# Altium footprint library Connector_art.PcbLib: 209 footprints (part 13 of 14)
Each footprint in its own frame and in the unit in brackets; x right, y up, seen from the top. Pads: shape width x height; smd on the part's side, far side on the other; paste and mask are expansions set on the pad; w line width, h text height; cw(c..) or ccw(c..) is an arc to the next point about the centre after c.
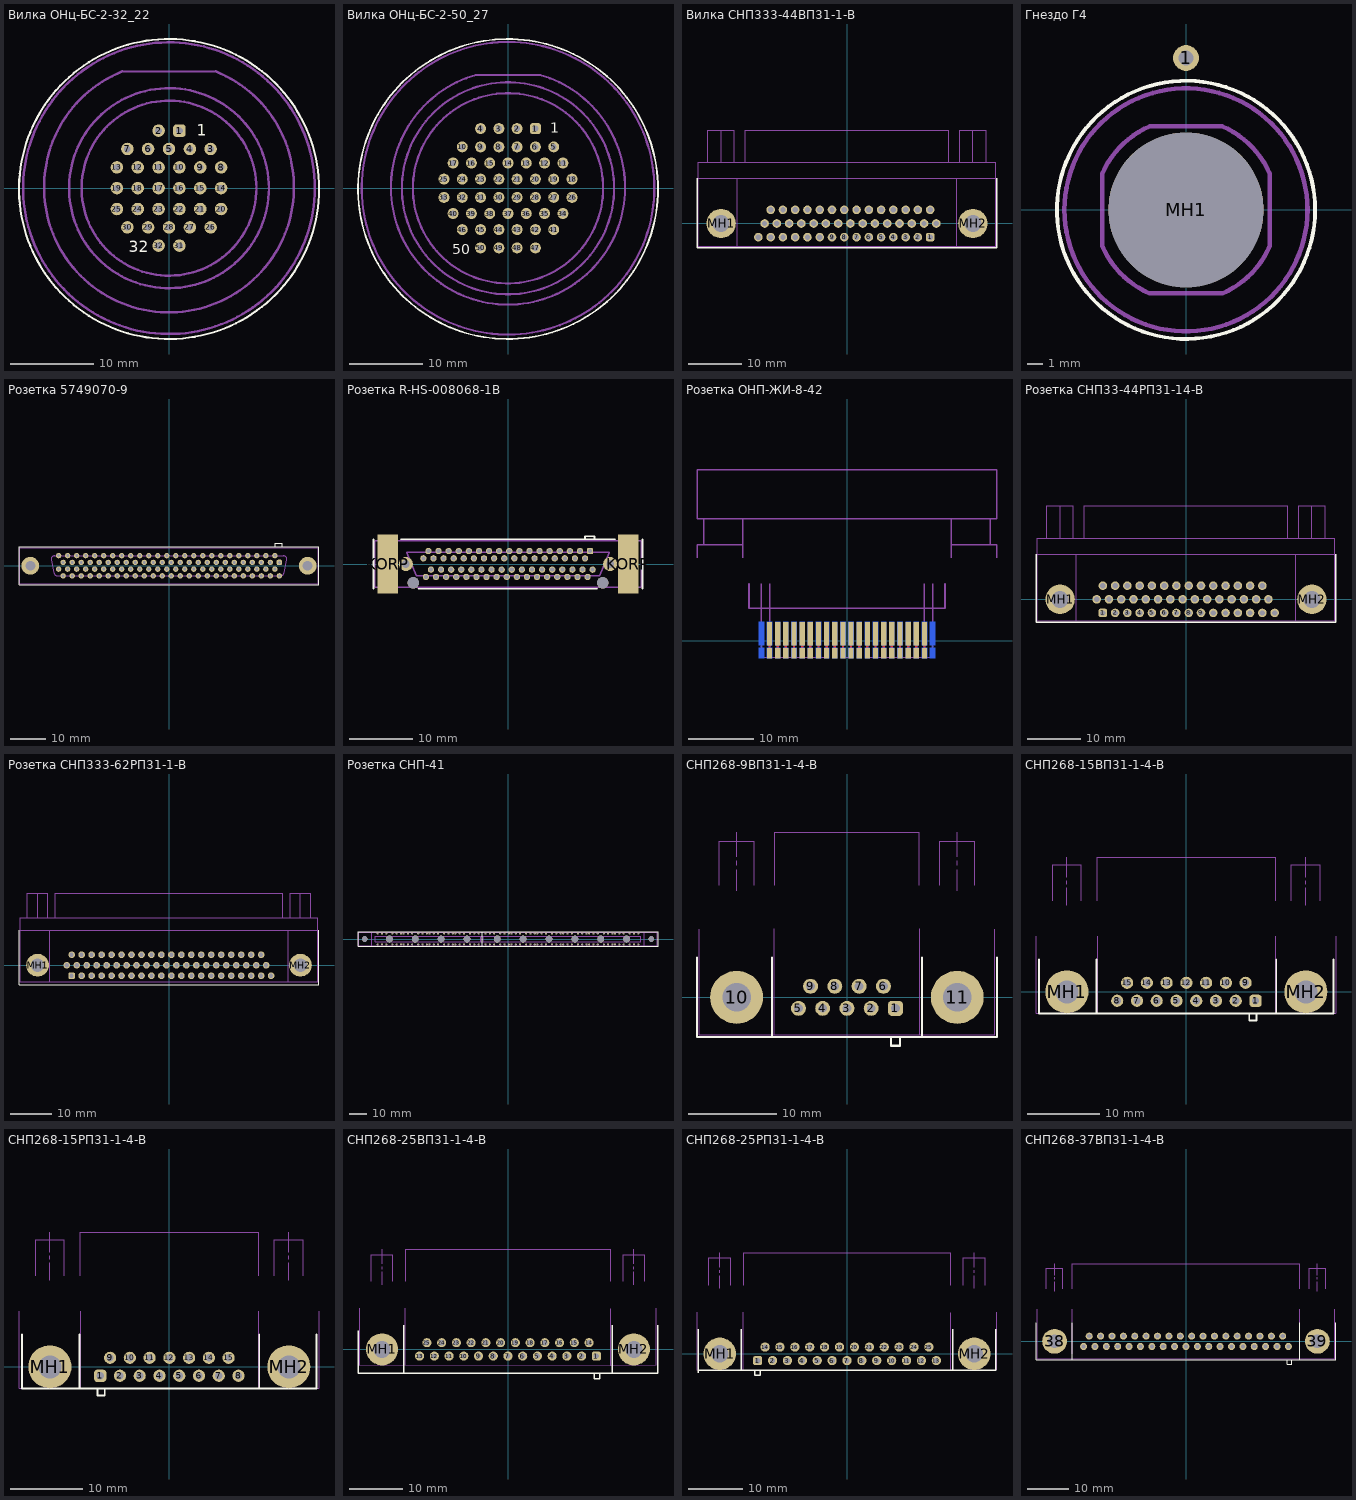
[diagram p12: the footprints below, top view; thin cyan lines are the x and y axes]

## Вилка ОНц-БС-2-32_22 [mm]
height 20
pads (32):
  rrect50% 1.5x1.5 hole 0.8: 1(1.25,6.9)
  round 1.5 hole 0.8: 2(-1.25,6.9) 3(5,4.7) 4(2.5,4.7) 5(0,4.7) 6(-2.5,4.7) 7(-5,4.7) 8(6.25,2.5) 9(3.75,2.5) 10(1.25,2.5) 11(-1.25,2.5) 12(-3.75,2.5) 13(-6.25,2.5) 14(6.25,0) 15(3.75,0) 16(1.25,0) 17(-1.25,0) 18(-3.75,0) 19(-6.25,0) 20(6.25,-2.5) 21(3.75,-2.5) 22(1.25,-2.5) 23(-1.25,-2.5) 24(-3.75,-2.5) 25(-6.25,-2.5) 26(5,-4.7) 27(2.5,-4.7) 28(0,-4.7) 29(-2.5,-4.7) 30(-5,-4.7) 31(1.25,-6.9) 32(-1.25,-6.9)
Top Overlay:
  circle w0.25: c0,-0.1 r18
  text "1" at 3.3,6.3 h1.38
  text "32" at -4.8,-7.7 h1.38
Bottom Overlay:
  circle w0.25: c0,0 r10.75
  text "1" at 3.9,6.3 h1.38
  text "32" at -2.8,-7.7 h1.38
Mechanical 1:
  circle w0.3: c0,0 r10.5
  circle w0.3: c0,0 r12
  circle w0.3: c0,0 r17.5
  circle w0.3: c-1.25,-6.9 r0.5
  circle w0.3: c1.25,-6.9 r0.5
  circle w0.3: c5,-4.7 r0.5
  circle w0.3: c2.5,-4.7 r0.5
  circle w0.3: c0,-4.7 r0.5
  circle w0.3: c-2.5,-4.7 r0.5
  circle w0.3: c-5,-4.7 r0.5
  circle w0.3: c-6.25,-2.5 r0.5
  circle w0.3: c-3.75,-2.5 r0.5
  circle w0.3: c-1.25,-2.5 r0.5
  circle w0.3: c1.25,-2.5 r0.5
  circle w0.3: c3.75,-2.5 r0.5
  circle w0.3: c6.25,-2.5 r0.5
  circle w0.3: c6.25,0 r0.5
  circle w0.3: c3.75,0 r0.5
  circle w0.3: c1.25,0 r0.5
  circle w0.3: c-1.25,0 r0.5
  circle w0.3: c-3.75,0 r0.5
  circle w0.3: c-6.25,0 r0.5
  circle w0.3: c-6.25,2.5 r0.5
  circle w0.3: c-3.75,2.5 r0.5
  circle w0.3: c-1.25,2.5 r0.5
  circle w0.3: c1.25,2.5 r0.5
  circle w0.3: c3.75,2.5 r0.5
  circle w0.3: c6.25,2.5 r0.5
  circle w0.3: c5,4.7 r0.5
  circle w0.3: c2.5,4.7 r0.5
  circle w0.3: c0,4.7 r0.5
  circle w0.3: c-2.5,4.7 r0.5
  circle w0.3: c-5,4.7 r0.5
  circle w0.3: c-1.25,6.9 r0.5
  circle w0.3: c1.25,6.9 r0.5
  lines w0.3: -5.605,14.013 ccw(c0,0.1) 5.605,14.013 ; -5.6,14 5.6,14
  text "1" at 3,6.3 h2
  text "32" at -4.5,-7.7 h2
3D body: height 19.9, standoff -3.5, extent -17.5,-18.486 17.5,18.486

## Вилка ОНц-БС-2-50_27 [mm]
height 20
pads (50):
  rrect50% 1.5x1.5 hole 0.8: 1(3.75,8.15)
  round 1.5 hole 0.8: 2(1.25,8.15) 3(-1.25,8.15) 4(-3.75,8.15) 5(6.25,5.65) 6(3.75,5.65) 7(1.25,5.65) 8(-1.25,5.65) 9(-3.75,5.65) 10(-6.25,5.65) 11(7.5,3.45) 12(5,3.45) 13(2.5,3.45) 14(0,3.45) 15(-2.5,3.45) 16(-5,3.45) 17(-7.5,3.45) 18(8.75,1.25) 19(6.25,1.25) 20(3.75,1.25) 21(1.25,1.25) 22(-1.25,1.25) 23(-3.75,1.25) 24(-6.25,1.25) 25(-8.75,1.25) 26(8.75,-1.25) 27(6.25,-1.25) 28(3.75,-1.25) 29(1.25,-1.25) 30(-1.25,-1.25) 31(-3.75,-1.25) 32(-6.25,-1.25) 33(-8.75,-1.25) 34(7.5,-3.45) 35(5,-3.45) 36(2.5,-3.45) 37(0,-3.45) 38(-2.5,-3.45) 39(-5,-3.45) 40(-7.5,-3.45) 41(6.25,-5.65) 42(3.75,-5.65) 43(1.25,-5.65) 44(-1.25,-5.65) 45(-3.75,-5.65) 46(-6.25,-5.65) 47(3.75,-8.15) 48(1.25,-8.15) 49(-1.25,-8.15) 50(-3.75,-8.15)
Top Overlay:
  circle w0.25: c0,-0.1 r20.5
  text "50" at -7.6,-9 h1.38
  text "1" at 5.8,7.6 h1.38
Bottom Overlay:
  circle w0.25: c0,0 r13
  text "50" at -5.5,-9 h1.38
  text "1" at 6.1,7.6 h1.38
Mechanical 1:
  circle w0.3: c0,0 r13
  circle w0.3: c0,0 r14.5
  circle w0.3: c0,0 r20
  circle w0.3: c-3.75,8.15 r0.5
  circle w0.3: c-1.25,8.15 r0.5
  circle w0.3: c1.25,8.15 r0.5
  circle w0.3: c3.75,8.15 r0.5
  circle w0.3: c-6.25,5.65 r0.5
  circle w0.3: c-3.75,5.65 r0.5
  circle w0.3: c-1.25,5.65 r0.5
  circle w0.3: c1.25,5.65 r0.5
  circle w0.3: c3.75,5.65 r0.5
  circle w0.3: c6.25,5.65 r0.5
  circle w0.3: c-7.5,3.45 r0.5
  circle w0.3: c-5,3.45 r0.5
  circle w0.3: c-2.5,3.45 r0.5
  circle w0.3: c0,3.45 r0.5
  circle w0.3: c2.5,3.45 r0.5
  circle w0.3: c5,3.45 r0.5
  circle w0.3: c7.5,3.45 r0.5
  circle w0.3: c8.75,1.25 r0.5
  circle w0.3: c6.25,1.25 r0.5
  circle w0.3: c3.75,1.25 r0.5
  circle w0.3: c1.25,1.25 r0.5
  circle w0.3: c-1.25,1.25 r0.5
  circle w0.3: c-3.75,1.25 r0.5
  circle w0.3: c-6.25,1.25 r0.5
  circle w0.3: c-8.75,1.25 r0.5
  circle w0.3: c-8.75,-1.25 r0.5
  circle w0.3: c-6.25,-1.25 r0.5
  circle w0.3: c-3.75,-1.25 r0.5
  circle w0.3: c-1.25,-1.25 r0.5
  circle w0.3: c1.25,-1.25 r0.5
  circle w0.3: c3.75,-1.25 r0.5
  circle w0.3: c6.25,-1.25 r0.5
  circle w0.3: c8.75,-1.25 r0.5
  circle w0.3: c7.5,-3.45 r0.5
  circle w0.3: c5,-3.45 r0.5
  circle w0.3: c2.5,-3.45 r0.5
  circle w0.3: c0,-3.45 r0.5
  circle w0.3: c-2.5,-3.45 r0.5
  circle w0.3: c-5,-3.45 r0.5
  circle w0.3: c-7.5,-3.45 r0.5
  circle w0.3: c-6.25,-5.65 r0.5
  circle w0.3: c-3.75,-5.65 r0.5
  circle w0.3: c-1.25,-5.65 r0.5
  circle w0.3: c1.25,-5.65 r0.5
  circle w0.3: c3.75,-5.65 r0.5
  circle w0.3: c6.25,-5.65 r0.5
  circle w0.3: c3.75,-8.15 r0.5
  circle w0.3: c1.25,-8.15 r0.5
  circle w0.3: c-1.25,-8.15 r0.5
  circle w0.3: c-3.75,-8.15 r0.5
  lines w0.25: -4.396,15.5 4.396,15.5
  lines w0.3: -4.396,15.484 ccw(c0,0.1) 4.396,15.484
  text "50" at -6.9,-9 h2
  text "1" at 5.2,7.5 h2
3D body: height 19.9, standoff -3.5, extent -20,-20.797 20,20.797

## Вилка СНП333-44ВП31-1-В [mm]
pads (46):
  rrect50% 1.6x1.6 hole 1: 1(15.52,-2.54)
  round 1.6 hole 1: 2(13.23,-2.54) 3(10.94,-2.54) 4(8.65,-2.54) 5(6.36,-2.54) 6(4.07,-2.54) 7(1.78,-2.54) 8(-0.51,-2.54) 9(-2.8,-2.54) 10(-5.09,-2.54) 11(-7.38,-2.54) 12(-9.67,-2.54) 13(-11.96,-2.54) 14(-14.25,-2.54) 15(-16.54,-2.54) 16(16.67,0) 17(14.38,0) 18(12.09,0) 19(9.8,0) 20(7.51,0) 21(5.22,0) 22(2.93,0) 23(0.64,0) 24(-1.65,0) 25(-3.94,0) 26(-6.23,0) 27(-8.52,0) 28(-10.81,0) 29(-13.1,0) 30(-15.39,0) 31(15.52,2.54) 32(13.23,2.54) 33(10.94,2.54) 34(8.65,2.54) 35(6.36,2.54) 36(4.07,2.54) 37(1.78,2.54) 38(-0.51,2.54) 39(-2.8,2.54) 40(-5.09,2.54) 41(-7.38,2.54) 42(-9.67,2.54) 43(-11.96,2.54) 44(-14.25,2.54)
  round 5.5 hole 3.2: MH1(-23.5,0) MH2(23.5,0)
Top Overlay:
  lines w0.25: -28,8.44 -28,-4.5 28,-4.5 28,8.44
Mechanical 1:
  lines w0.2: -27.75,8.44 27.75,8.44 ; -26,11.44 -26,17.44 -21,17.44 -21,11.44 ; -23.5,11.44 -23.5,17.44 ; -20.5,-4.56 -20.5,8.44 ; -19,11.44 -19,17.44 19,17.44 19,11.44 ; 20.5,-4.56 20.5,8.44 ; 21,11.44 21,17.44 26,17.44 26,11.44 ; 23.5,11.44 23.5,17.44 ; -27.75,-4.25 27.75,-4.25 27.75,11.44 -27.75,11.44 -27.75,-4.25
  text "1" at 17.052,-3.797 h2.12
  text "15" at -20.174,-3.797 h2.12
  text "31" at 16.656,1.283 h2.12
  text "16" at 17.926,-1.257 h2.12
  text "44" at -17.634,1.283 h2.12
  text "30" at -18.904,-1.257 h2.12
3D body: height 13.9, standoff -3.9, extent -27.8,-4.31 27.8,17.49

## Гнездо Г4 [mm]
height 8.58
pads (2):
  round 1.7 hole 1: 1(0,10)
  round 10.2 hole 10.2 unplated paste+0: MH1(0,0)
Top Overlay:
  circle w0.25: c0,0 r8.5
Bottom Overlay:
  circle w0.25: c0,10 r1.25
  circle w0.25: c0,0 r7
Mechanical 1:
  circle w0.3: c0,0 r2
  circle w0.3: c0,0 r4.5
  circle w0.3: c-0.003,0 r8
  lines w0.3: -5.5,-2.4 -5.5,2.4 ; -5.499,-2.4 ccw(c0,0) -2.4,-5.499 ; -5.499,2.4 cw(c0,0) -2.4,5.499 ; -2.4,-5.5 2.4,-5.5 ; -2.4,5.5 2.4,5.5 ; 2.4,-5.499 ccw(c0,0) 5.499,-2.4 ; 2.4,5.499 cw(c0,0) 5.499,2.4 ; 5.5,-2.4 5.5,2.4
3D body: height 8.5, standoff -17, extent -8.002,-8.002 7.998,7.998

## Розетка 5749070-9 [mm]
height 8
pads (102):
  rrect50% 1.5x1.5 hole 0.8: 1(31.115,0.95)
  round 1.5 hole 0.8: 2(29.845,2.85) 3(28.575,0.95) 4(27.305,2.85) 5(26.035,0.95) 6(24.765,2.85) 7(23.495,0.95) 8(22.225,2.85) 9(20.955,0.95) 10(19.685,2.85) 11(18.415,0.95) 12(17.145,2.85) 13(15.875,0.95) 14(14.605,2.85) 15(13.335,0.95) 16(12.065,2.85) 17(10.795,0.95) 18(9.525,2.85) 19(8.255,0.95) 20(6.985,2.85) 21(5.715,0.95) 22(4.445,2.85) 23(3.175,0.95) 24(1.905,2.85) 25(0.635,0.95) 26(-0.635,2.85) 27(-1.905,0.95) 28(-3.175,2.85) 29(-4.445,0.95) 30(-5.715,2.85) 31(-6.985,0.95) 32(-8.255,2.85) 33(-9.525,0.95) 34(-10.795,2.85) 35(-12.065,0.95) 36(-13.335,2.85) 37(-14.605,0.95) 38(-15.875,2.85) 39(-17.145,0.95) 40(-18.415,2.85) 41(-19.685,0.95) 42(-20.955,2.85) 43(-22.225,0.95) 44(-23.495,2.85) 45(-24.765,0.95) 46(-26.035,2.85) 47(-27.305,0.95) 48(-28.575,2.85) 49(-29.845,0.95) 50(-31.115,2.85) 51(31.115,-2.85) 52(29.845,-0.95) 53(28.575,-2.85) 54(27.305,-0.95) 55(26.035,-2.85) 56(24.765,-0.95) 57(23.495,-2.85) 58(22.225,-0.95) 59(20.955,-2.85) 60(19.685,-0.95) 61(18.415,-2.85) 62(17.145,-0.95) 63(15.875,-2.85) 64(14.605,-0.95) 65(13.335,-2.85) 66(12.065,-0.95) 67(10.795,-2.85) 68(9.525,-0.95) 69(8.255,-2.85) 70(6.985,-0.95) 71(5.715,-2.85) 72(4.445,-0.95) 73(3.175,-2.85) 74(1.905,-0.95) 75(0.635,-2.85) 76(-0.635,-0.95) 77(-1.905,-2.85) 78(-3.175,-0.95) 79(-4.445,-2.85) 80(-5.715,-0.95) 81(-6.985,-2.85) 82(-8.255,-0.95) 83(-9.525,-2.85) 84(-10.795,-0.95) 85(-12.065,-2.85) 86(-13.335,-0.95) 87(-14.605,-2.85) 88(-15.875,-0.95) 89(-17.145,-2.85) 90(-18.415,-0.95) 91(-19.685,-2.85) 92(-20.955,-0.95) 93(-22.225,-2.85) 94(-23.495,-0.95) 95(-24.765,-2.85) 96(-26.035,-0.95) 97(-27.305,-2.85) 98(-28.575,-0.95) 99(-29.845,-2.85) 100(-31.115,-0.95)
  round 5 hole 2.8: MH28(-39.115,0) MH28(39.115,0)
Top Overlay:
  lines w0.25: 30,5.3 30,6.3 32,6.3 32,5.3 ; -42.3,-5.3 42.3,-5.3 42.3,5.3 -42.3,5.3 -42.3,-5.3
Mechanical 1:
  lines w0.2: -42.1,-5.1 42.1,-5.1 42.1,5.1 -42.1,5.1 -42.1,-5.1
  lines w0.25: -33.242,1.675 -32.435,-2.005 ; -33.235,1.676 cw(c-32.25,1.85) -32.25,2.85 ; -32.45,2.85 32.45,2.85 ; -32.438,-2.006 ccw(c-31.45,-1.85) -31.45,-2.85 31.45,-2.85 ccw(c31.45,-1.85) 32.45,-1.85 ; 32.25,2.85 cw(c32.25,1.85) 33.235,1.676 ; 32.435,-2.008 33.242,1.675
3D body: height 8.81, standoff -3.18, extent -42.1,-5.156 42.101,5.156

## Розетка R-HS-008068-1B [mm]
height 11
pads (74):
  rrect50% 1x1 hole 0.65: 1(13,2.05)
  round 1 hole 0.65: 2(12.2,0.9) 3(11.4,2.05) 4(10.6,0.9) 5(9.8,2.05) 6(9,0.9) 7(8.2,2.05) 8(7.4,0.9) 9(6.6,2.05) 10(5.8,0.9) 11(5,2.05) 12(4.2,0.9) 13(3.4,2.05) 14(2.6,0.9) 15(1.8,2.05) 16(1,0.9) 17(0.2,2.05) 18(-0.6,0.9) 19(-1.4,2.05) 20(-2.2,0.9) 21(-3,2.05) 22(-3.8,0.9) 23(-4.6,2.05) 24(-5.4,0.9) 25(-6.2,2.05) 26(-7,0.9) 27(-7.8,2.05) 28(-8.6,0.9) 29(-9.4,2.05) 30(-10.2,0.9) 31(-11,2.05) 32(-11.8,0.9) 33(-12.6,2.05) 34(-13.4,0.9) 35(13.4,-0.9) 36(12.6,-2.05) 37(11.8,-0.9) 38(11,-2.05) 39(10.2,-0.9) 40(9.4,-2.05) 41(8.6,-0.9) 42(7.8,-2.05) 43(7,-0.9) 44(6.2,-2.05) 45(5.4,-0.9) 46(4.6,-2.05) 47(3.8,-0.9) 48(3,-2.05) 49(2.2,-0.9) 50(1.4,-2.05) 51(0.6,-0.9) 52(-0.2,-2.05) 53(-1,-0.9) 54(-1.8,-2.05) 55(-2.6,-0.9) 56(-3.4,-2.05) 57(-4.2,-0.9) 58(-5,-2.05) 59(-5.8,-0.9) 60(-6.6,-2.05) 61(-7.4,-0.9) 62(-8.2,-2.05) 63(-9,-0.9) 64(-9.8,-2.05) 65(-10.6,-0.9) 66(-11.4,-2.05) 67(-12.2,-0.9) 68(-13,-2.05)
  rect 3.25x9.4 smd: KORP(-19.055,0) KORP(19.055,0)
  round 2.25 hole 1.2: MH12(-16.175,0) MH12(16.175,0)
  round 1.8 hole 1.8 unplated: MH18(-15,-2.98) MH18(15,-2.98)
Top Overlay:
  lines w0.25: -21.3,-3.9 -21.3,3.9 ; -17,3.9 17,3.9 ; -14.2,-3.9 14.1,-3.9 ; 12.2,3.9 12.2,4.4 13.7,4.4 13.7,3.9 ; 21.3,-3.9 21.3,3.9
Mechanical 1:
  circle w0.2: c18.85,0 r1
  circle w0.2: c-18.85,0 r1
  lines w0.2: -21.1,-3.7 21.1,-3.7 21.1,3.7 -21.1,3.7 -21.1,-3.7
  lines w0.25: -14.5,-1.85 14.5,-1.85 ; -14.5,-1.8 -16,1.85 16,1.85 14.5,-1.8
Mechanical 2:
  text "33" at -13.4,1.7 h1.5
  text "34" at -14.2,0.5 h1.5
  text "67" at -13,-1.3 h1.5
  text "68" at -13.8,-2.5 h1.5
  text "1" at 14.2,1.6 h1.5
  text "2" at 13.6,0.4 h1.5
  text "35" at 15.3,-1.4 h1.5
  text "36" at 14.6,-2.6 h1.5
3D body: height 10.7, standoff -2.87, extent -21.1,-3.73 21.1,3.73

## Розетка ОНП-ЖИ-8-42 [mm]
pads (84):
  rect 0.8x1.6 smd: 1(11.875,-1.875) 2(10.625,-1.875) 3(9.375,-1.875) 4(8.125,-1.875) 5(6.875,-1.875) 6(5.625,-1.875) 7(4.375,-1.875) 8(3.125,-1.875) 9(1.875,-1.875) 10(0.625,-1.875) 11(-0.625,-1.875) 12(-1.875,-1.875) 13(-3.125,-1.875) 14(-4.375,-1.875) 15(-5.625,-1.875) 16(-6.875,-1.875) 17(-8.125,-1.875) 18(-9.375,-1.875) 19(-10.625,-1.875) 20(-11.875,-1.875)
  rect 0.8x3.6 smd: 1(11.875,1.125) 2(10.625,1.125) 3(9.375,1.125) 4(8.125,1.125) 5(6.875,1.125) 6(5.625,1.125) 7(4.375,1.125) 8(3.125,1.125) 9(1.875,1.125) 10(0.625,1.125) 11(-0.625,1.125) 12(-1.875,1.125) 13(-3.125,1.125) 14(-4.375,1.125) 15(-5.625,1.125) 16(-6.875,1.125) 17(-8.125,1.125) 18(-9.375,1.125) 19(-10.625,1.125) 20(-11.875,1.125)
  rect 0.8x1.6 smd far side: 21(13.125,-1.875) 22(11.875,-1.875) 23(10.625,-1.875) 24(9.375,-1.875) 25(8.125,-1.875) 26(6.875,-1.875) 27(5.625,-1.875) 28(4.375,-1.875) 29(3.125,-1.875) 30(1.875,-1.875) 31(0.625,-1.875) 32(-0.625,-1.875) 33(-1.875,-1.875) 34(-3.125,-1.875) 35(-4.375,-1.875) 36(-5.625,-1.875) 37(-6.875,-1.875) 38(-8.125,-1.875) 39(-9.375,-1.875) 40(-10.625,-1.875) 41(-11.875,-1.875) 42(-13.125,-1.875)
  rect 0.8x3.6 smd far side: 21(13.125,1.125) 22(11.875,1.125) 23(10.625,1.125) 24(9.375,1.125) 25(8.125,1.125) 26(6.875,1.125) 27(5.625,1.125) 28(4.375,1.125) 29(3.125,1.125) 30(1.875,1.125) 31(0.625,1.125) 32(-0.625,1.125) 33(-1.875,1.125) 34(-3.125,1.125) 35(-4.375,1.125) 36(-5.625,1.125) 37(-6.875,1.125) 38(-8.125,1.125) 39(-9.375,1.125) 40(-10.625,1.125) 41(-11.875,1.125) 42(-13.125,1.125)
Top Layer:
  lines w0.35: -11.875,-1.375 -11.875,-0.375 ; -10.625,-1.375 -10.625,-0.375 ; -9.375,-1.375 -9.375,-0.375 ; -8.125,-1.375 -8.125,-0.375 ; -6.875,-1.375 -6.875,-0.375 ; -5.625,-1.375 -5.625,-0.375 ; -4.375,-1.375 -4.375,-0.375 ; -3.125,-1.125 -3.125,-0.125 ; -1.875,-1.375 -1.875,-0.375 ; -0.625,-1.375 -0.625,-0.375 ; 0.625,-1.375 0.625,-0.375 ; 1.875,-1.375 1.875,-0.375 ; 3.125,-1.375 3.125,-0.375 ; 4.375,-1.375 4.375,-0.375 ; 5.625,-1.375 5.625,-0.375 ; 6.875,-1.375 6.875,-0.375 ; 8.125,-1.375 8.125,-0.375 ; 9.375,-1.125 9.375,-0.125 ; 10.625,-1.375 10.625,-0.375 ; 11.875,-1.375 11.875,-0.375
Bottom Layer:
  lines w0.35: -13.125,-1.375 -13.125,-0.375 ; -11.875,-1.375 -11.875,-0.375 ; -10.625,-1.375 -10.625,-0.375 ; -9.375,-1.375 -9.375,-0.375 ; -8.125,-1.375 -8.125,-0.375 ; -6.875,-1.375 -6.875,-0.375 ; -5.625,-1.375 -5.625,-0.375 ; -4.375,-1.375 -4.375,-0.375 ; -3.125,-1.375 -3.125,-0.375 ; -1.875,-1.375 -1.875,-0.375 ; -0.625,-1.375 -0.625,-0.375 ; 0.625,-1.375 0.625,-0.375 ; 1.875,-1.375 1.875,-0.375 ; 3.125,-1.375 3.125,-0.375 ; 4.375,-1.375 4.375,-0.375 ; 5.625,-1.375 5.625,-0.375 ; 6.875,-1.375 6.875,-0.375 ; 8.125,-1.375 8.125,-0.375 ; 9.375,-1.375 9.375,-0.375 ; 10.625,-1.375 10.625,-0.375 ; 11.875,-1.375 11.875,-0.375 ; 13.125,-1.375 13.125,-0.375
Mechanical 1:
  lines w0.1: -11.875,-2.5 -3.13,-2.5 ; -0.63,-2.5 0.63,-2.5 ; 3.13,-2.5 11.875,-2.5
  lines w0.2: -23,12.75 -23,14.75 -16,14.75 ; -22,14.75 -22,18.75 ; -16,12.75 -16,18.75 ; -11.875,-2.5 -11.875,8.75 ; 11.875,-2.5 11.875,8.75 ; 16,12.75 16,18.75 ; 16,14.75 23,14.75 23,12.75 ; 22,14.75 22,18.75 ; -22,18.75 -16,18.75 ; -22,18.75 -23,18.75 -23,26.25 23,26.25 23,18.75 22,18.75 ; -16,18.75 16,18.75 ; 16,18.75 22,18.75
  lines w0.3: -15,8.75 -15,5 15,5 15,8.75
  text ".Designator" at -2.5,5.625 h1.5
  text "20" at -11.25,-1.875 h1.5
  text "1" at 10.625,-1.875 h1.5
Mechanical 2:
  lines w0.1: -13.125,-2.5 -3.13,-2.5 ; -0.63,-2.5 0.63,-2.5 ; 3.13,-2.5 13.125,-2.5
  lines w0.2: -23,12.75 -23,14.75 -16,14.75 ; -22,14.75 -22,18.75 ; -16,12.75 -16,18.75 ; -13.13,-2.5 -13.13,8.75 ; 13.13,-2.5 13.13,8.75 ; 16,12.75 16,18.75 ; 16,14.75 23,14.75 23,12.75 ; 22,14.75 22,18.75 ; -22,18.75 -16,18.75 ; -22,18.75 -23,18.75 -23,26.25 23,26.25 23,18.75 22,18.75 ; -16,18.75 16,18.75 ; 16,18.75 22,18.75
  text ".Designator" at 1.875,5.625 h1.5
  text "42" at -11.25,-1.875 h1.5
  text "21" at 12.5,-1.875 h1.5
3D body: height 3.4, standoff -4.7, extent -22.744,-1.7 23.265,19.8

## Розетка СНП33-44РП31-14-В [mm]
height 13
pads (46):
  rrect50% 1.6x1.6 hole 1: 1(-15.52,-2.54)
  round 1.6 hole 1: 2(-13.23,-2.54) 3(-10.94,-2.54) 4(-8.65,-2.54) 5(-6.36,-2.54) 6(-4.07,-2.54) 7(-1.78,-2.54) 8(0.51,-2.54) 9(2.8,-2.54) 10(5.09,-2.54) 11(7.38,-2.54) 12(9.67,-2.54) 13(11.96,-2.54) 14(14.25,-2.54) 15(16.54,-2.54) 16(-16.67,0) 17(-14.38,0) 18(-12.09,0) 19(-9.8,0) 20(-7.51,0) 21(-5.22,0) 22(-2.93,0) 23(-0.64,0) 24(1.65,0) 25(3.94,0) 26(6.23,0) 27(8.52,0) 28(10.81,0) 29(13.1,0) 30(15.39,0) 31(-15.52,2.54) 32(-13.23,2.54) 33(-10.94,2.54) 34(-8.65,2.54) 35(-6.36,2.54) 36(-4.07,2.54) 37(-1.78,2.54) 38(0.51,2.54) 39(2.8,2.54) 40(5.09,2.54) 41(7.38,2.54) 42(9.67,2.54) 43(11.96,2.54) 44(14.25,2.54)
  round 5.5 hole 3.2: MH1(-23.5,0) MH2(23.5,0)
Top Overlay:
  lines w0.25: -28,8.44 -28,-4.25 28,-4.25 28,8.44
Mechanical 1:
  lines w0.2: -27.75,8.44 27.75,8.44 ; -26,11.44 -26,17.44 -21,17.44 -21,11.44 ; -23.5,11.44 -23.5,17.44 ; -20.5,-4 -20.5,8.44 ; -19,11.44 -19,17.44 19,17.44 19,11.44 ; 20.5,-4 20.5,8.44 ; 21,11.44 21,17.44 26,17.44 26,11.44 ; 23.5,11.44 23.5,17.44 ; -27.75,-4 27.75,-4 27.75,11.44 -27.75,11.44 -27.75,-4
  text "15" at 17.276,-3.717 h2.12
  text "1" at -18.828,-3.717 h2.12
  text "30" at 16.776,-1.217 h2.12
  text "44" at 15.276,1.283 h2.12
  text "16" at -20.224,-1.217 h2.12
  text "31" at -19.224,1.283 h2.12
3D body: height 13.5, standoff -4, extent -27.8,-4.01 27.8,17.79

## Розетка СНП333-62РП31-1-В [mm]
height 13
pads (64):
  rrect50% 1.6x1.6 hole 1: 1(-23.52,-2.54)
  round 1.6 hole 1: 2(-21.11,-2.54) 3(-18.7,-2.54) 4(-16.29,-2.54) 5(-13.88,-2.54) 6(-11.47,-2.54) 7(-9.06,-2.54) 8(-6.65,-2.54) 9(-4.24,-2.54) 10(-1.83,-2.54) 11(0.58,-2.54) 12(2.99,-2.54) 13(5.4,-2.54) 14(7.81,-2.54) 15(10.22,-2.54) 16(12.63,-2.54) 17(15.04,-2.54) 18(17.45,-2.54) 19(19.86,-2.54) 20(22.27,-2.54) 21(24.68,-2.54) 22(-24.72,0) 23(-22.31,0) 24(-19.9,0) 25(-17.49,0) 26(-15.08,0) 27(-12.67,0) 28(-10.26,0) 29(-7.85,0) 30(-5.44,0) 31(-3.03,0) 32(-0.62,0) 33(1.79,0) 34(4.2,0) 35(6.61,0) 36(9.02,0) 37(11.43,0) 38(13.84,0) 39(16.25,0) 40(18.66,0) 41(21.07,0) 42(23.48,0) 43(-23.52,2.54) 44(-21.11,2.54) 45(-18.7,2.54) 46(-16.29,2.54) 47(-13.88,2.54) 48(-11.47,2.54) 49(-9.06,2.54) 50(-6.65,2.54) 51(-4.24,2.54) 52(-1.83,2.54) 53(0.58,2.54) 54(2.99,2.54) 55(5.4,2.54) 56(7.81,2.54) 57(10.22,2.54) 58(12.63,2.54) 59(15.04,2.54) 60(17.45,2.54) 61(19.86,2.54) 62(22.27,2.54)
  round 5.5 hole 3.2: MH1(-31.75,0) MH2(31.75,0)
Top Overlay:
  lines w0.25: -36.25,8.44 -36.25,-4.76 36.25,-4.76 36.25,8.44
Mechanical 1:
  lines w0.2: -36,8.44 36,8.44 ; -34.25,11.44 -34.25,17.44 -29.25,17.44 -29.25,11.44 ; -31.75,11.44 -31.75,17.44 ; -28.8,-4 -28.8,8.44 ; -27.5,11.44 -27.5,17.44 27.5,17.44 27.5,11.44 ; 28.8,-4 28.8,8.44 ; 29.25,11.44 29.25,17.44 34.25,17.44 34.25,11.44 ; 31.75,11.44 31.75,17.44 ; -36,-4 36,-4 36,11.44 -36,11.44 -36,-4
  text "21" at 24.896,-3.717 h2.12
  text "1" at -26.448,-3.717 h2.12
  text "42" at 24.396,-1.217 h2.12
  text "62" at 22.896,1.283 h2.12
  text "43" at -26.844,1.283 h2.12
  text "22" at -27.844,-1.217 h2.12
3D body: height 13.5, standoff -4, extent -36,-4.01 36,17.79

## Розетка СНП-41 [mm]
pads (132):
  round 1.2 hole 0.6: A1(-75.5,-3.125) A2(-73,-3.125) A3(-70.5,-3.125) A4(-67,-3.125) A5(-64.5,-3.125) A6(-62,-3.125) A7(-60.5,-3.125) A8(-58,-3.125) A9(-55.5,-3.125) A10(-52,-3.125) A11(-49.5,-3.125) A12(-47,-3.125) A13(-45.5,-3.125) A14(-43,-3.125) A15(-40.5,-3.125) A16(-37,-3.125) A17(-34.5,-3.125) A18(-32,-3.125) A19(-30.5,-3.125) A20(-28,-3.125) A21(-25.5,-3.125) A22(-22,-3.125) A23(-19.5,-3.125) A24(-17,-3.125) A25(-13,-3.125) A26(-10.5,-3.125) A27(-8,-3.125) A28(-4.5,-3.125) A29(-2,-3.125) A30(0.5,-3.125) A31(2,-3.125) A32(4.5,-3.125) A33(7,-3.125) A34(10.5,-3.125) A35(13,-3.125) A36(15.5,-3.125) A37(17,-3.125) A38(19.5,-3.125) A39(22,-3.125) A40(25.5,-3.125) A41(28,-3.125) A42(30.5,-3.125) A43(32,-3.125) A44(34.5,-3.125) A45(37,-3.125) A46(40.5,-3.125) A47(43,-3.125) A48(45.5,-3.125) A49(47,-3.125) A50(49.5,-3.125) A51(52,-3.125) A52(55.5,-3.125) A53(58,-3.125) A54(60.5,-3.125) A55(62,-3.125) A56(64.5,-3.125) A57(67,-3.125) A58(70.5,-3.125) A59(73,-3.125) A60(75.5,-3.125) B1(-75.5,3.125) B2(-73,3.125) B3(-70.5,3.125) B4(-67,3.125) B5(-64.5,3.125) B6(-62,3.125) B7(-60.5,3.125) B8(-58,3.125) B9(-55.5,3.125) B10(-52,3.125) B11(-49.5,3.125) B12(-47,3.125) B13(-45.5,3.125) B14(-43,3.125) B15(-40.5,3.125) B16(-37,3.125) B17(-34.5,3.125) B18(-32,3.125) B19(-30.5,3.125) B20(-28,3.125) B21(-25.5,3.125) B22(-22,3.125) B23(-19.5,3.125) B24(-17,3.125) B25(-13,3.125) B26(-10.5,3.125) B27(-8,3.125) B28(-4.5,3.125) B29(-2,3.125) B30(0.5,3.125) B31(2,3.125) B32(4.5,3.125) B33(7,3.125) B34(10.5,3.125) B35(13,3.125) B36(15.5,3.125) B37(17,3.125) B38(19.5,3.125) B39(22,3.125) B40(25.5,3.125) B41(28,3.125) B42(30.5,3.125) B43(32,3.125) B44(34.5,3.125) B45(37,3.125) B46(40.5,3.125) B47(43,3.125) B48(45.5,3.125) B49(47,3.125) B50(49.5,3.125) B51(52,3.125) B52(55.5,3.125) B53(58,3.125) B54(60.5,3.125) B55(62,3.125) B56(64.5,3.125) B57(67,3.125) B58(70.5,3.125) B59(73,3.125) B60(75.5,3.125)
  round 4 hole 4 unplated: H(-68.75,0) H(-53.75,0) H(-38.75,0) H(-23.75,0) H(-6.25,0) H(8.75,0) H(23.75,0) H(38.75,0) H(53.75,0) H(68.75,0)
  round 3.2 hole 3.2 unplated: MH1(-83,0) MH2(83,0)
Top Overlay:
  lines w0.25: -15,-4.3 -15,4.3 ; -86.9,-4.3 -86.9,4.3 86.9,4.3 86.9,-4.3 -86.9,-4.3
Mechanical 1:
  lines w0.3: -79,-3.95 -79,3.95 ; -15.7,-1.7 -15.7,1.7 ; -14.4,-1.7 -14.4,1.7 ; 79,-3.95 79,3.95 ; -86.5,-3.95 -86.5,3.95 86.5,3.95 86.5,-3.95 -86.5,-3.95 ; -77,-1.7 77,-1.7 77,1.7 -77,1.7 -77,-1.7
  text "A1" at -78.5,-3.5 h2
  text "Б1" at -78.5,2.2 h2
  text "Б60" at 75.5,2.2 h2
  text "A60" at 75.5,-3.5 h2
3D body: height 20.9, standoff -9, extent -86.5,-3.95 86.5,3.95

## СНП268-9ВП31-1-4-В [mm]
pads (11):
  rrect50% 1.7x1.7 hole 1: 1(5.495,-1.255)
  round 1.7 hole 1: 2(2.745,-1.255) 3(-0.005,-1.255) 4(-2.755,-1.255) 5(-5.505,-1.255) 6(4.125,1.245) 7(1.375,1.245) 8(-1.385,1.245) 9(-4.135,1.245)
  round 6 hole 3.2: 10(-12.505,-0.005) 11(12.495,-0.005)
Top Overlay:
  lines w0.25: -17,4.5 -17,-4.5 17,-4.5 17,4.5 ; -8.5,-4.5 -8.5,4.5 ; 5,-4.5 5,-5.5 6,-5.5 6,-4.5 ; 8.5,-4.5 8.5,4.5
Mechanical 1:
  circle w0.013: c12.495,-0.005 r1.5
  circle w0.13: c-12.505,-0.005 r1.5
  lines w0.025: -14.385,-0.005 -10.635,-0.005 ; -12.505,-1.885 -12.505,1.875 ; -12.505,12.075 -12.505,14.445 ; -12.505,14.945 -12.505,15.445 ; -12.505,15.945 -12.505,18.695 ; 10.625,-0.005 14.375,-0.005 ; 12.495,-1.885 12.495,1.875 ; 12.495,12.075 12.495,14.445 ; 12.495,14.945 12.495,15.445 ; 12.495,15.945 12.495,18.695
  lines w0.13: -16.755,7.695 -16.755,-4.25 16.745,-4.25 16.745,6.495 16.745,7.695 ; -14.505,12.695 -14.505,17.695 -10.505,17.695 -10.505,12.695 ; -8.25,-4.25 -8.25,7.75 ; -8.205,12.695 -8.205,18.695 ; -8.2,18.7 8.2,18.7 ; 8.195,12.695 8.195,18.695 ; 8.25,-4.25 8.25,7.75 ; 10.495,12.695 10.495,17.695 14.495,17.695 14.495,12.695
  text "1" at 5.737,-2.249 h2
  text "5" at -6.906,-2.249 h2
  text "6" at 4.344,0.251 h2
  text "9" at -5.656,0.251 h2
Mechanical 2:
  circle w0.013: c12.495,-0.005 r1.5
  circle w0.13: c-12.505,-0.005 r1.5
  lines w0.025: -14.385,-0.005 -10.635,-0.005 ; -12.505,-1.885 -12.505,1.875 ; 10.625,-0.005 14.375,-0.005 ; 12.495,-1.885 12.495,1.875
3D body: height 13.25, standoff -3.75, extent -16.75,-4.25 16.75,17.75

## СНП268-15ВП31-1-4-В [mm]
pads (17):
  rrect50% 1.7x1.7 hole 1: 1(9.63,-1.25)
  round 1.7 hole 1: 2(6.88,-1.25) 3(4.13,-1.25) 4(1.38,-1.25) 5(-1.38,-1.25) 6(-4.13,-1.25) 7(-6.88,-1.25) 8(-9.63,-1.25) 9(8.25,1.25) 10(5.5,1.25) 11(2.75,1.25) 12(0,1.25) 13(-2.75,1.25) 14(-5.5,1.25) 15(-8.25,1.25)
  round 6 hole 3.2: MH1(-16.63,0) MH2(16.63,0)
Top Overlay:
  lines w0.25: -20.5,4.5 -20.5,-3 20.5,-3 20.5,4.5 ; -12.5,-3 -12.5,4.5 ; 8.75,-3 8.75,-4 9.75,-4 9.75,-3 ; 12.5,-3 12.5,4.5
Mechanical 1:
  circle w0.13: c16.63,0 r1.5
  circle w0.13: c-16.63,0 r1.5
  lines w0.025: -18.5,0 -14.75,0 ; -16.63,-1.88 -16.63,1.88 ; -16.63,12.08 -16.63,14.45 ; -16.63,14.95 -16.63,15.45 ; -16.63,15.95 -16.63,18.7 ; 14.75,0 18.5,0 ; 16.63,-1.88 16.63,1.88 ; 16.63,12.08 16.63,14.45 ; 16.63,14.95 16.63,15.45 ; 16.63,15.95 16.63,18.7
  lines w0.13: -20.93,-3 -20.93,7.7 ; -20.9,-3 20.8,-3 ; -18.63,12.7 -18.63,17.7 -14.63,17.7 -14.63,12.7 ; -12.43,12.7 -12.43,18.7 ; -12.4,18.7 12.4,18.7 ; -12.33,-3 -12.33,7.7 ; 12.43,-3 12.43,7.7 ; 12.43,12.7 12.43,18.7 ; 14.63,12.7 14.63,17.7 18.63,17.7 18.63,12.7 ; 20.83,-3 20.83,6.5 20.83,7.7
  text "9" at 8.094,0.251 h2
  text "1" at 9.487,-2.249 h2
  text "15" at -9.806,0.251 h2
  text "8" at -10.656,-2.249 h2
Mechanical 2:
  circle w0.13: c16.63,0 r1.5
  circle w0.13: c-16.63,0 r1.5
  lines w0.025: -18.5,0 -14.75,0 ; -16.63,-1.88 -16.63,1.88 ; 14.75,0 18.5,0 ; 16.63,-1.88 16.63,1.88
3D body: height 13.5, standoff -3.5, extent -20.9,-4.25 20.9,17.75

## СНП268-15РП31-1-4-В [mm]
pads (17):
  rrect50% 1.7x1.7 hole 1: 1(-9.63,-1.25)
  round 1.7 hole 1: 2(-6.88,-1.25) 3(-4.13,-1.25) 4(-1.38,-1.25) 5(1.38,-1.25) 6(4.13,-1.25) 7(6.88,-1.25) 8(9.63,-1.25) 9(-8.25,1.25) 10(-5.5,1.25) 11(-2.75,1.25) 12(0,1.25) 13(2.75,1.25) 14(5.5,1.25) 15(8.25,1.25)
  round 6 hole 3.2: MH1(-16.63,0) MH2(16.63,0)
Top Overlay:
  lines w0.25: -20.5,4.5 -20.5,-3 20.5,-3 20.5,4.5 ; -12.5,-3 -12.5,4.5 ; -10,-3 -10,-4 -9,-4 -9,-3 ; 12.5,-3 12.5,4.5
Mechanical 1:
  circle w0.13: c16.63,0 r1.5
  circle w0.13: c-16.63,0 r1.5
  lines w0.025: -18.5,0 -14.75,0 ; -16.63,-1.88 -16.63,1.88 ; -16.63,12.08 -16.63,14.45 ; -16.63,14.95 -16.63,15.45 ; -16.63,15.95 -16.63,18.7 ; 14.75,0 18.5,0 ; 16.63,-1.88 16.63,1.88 ; 16.63,12.08 16.63,14.45 ; 16.63,14.95 16.63,15.45 ; 16.63,15.95 16.63,18.7
  lines w0.13: -20.93,-3 -20.93,7.7 ; -20.9,-3 20.8,-3 ; -18.63,12.7 -18.63,17.7 -14.63,17.7 -14.63,12.7 ; -12.43,12.7 -12.43,18.7 ; -12.4,18.7 12.4,18.7 ; -12.33,-3 -12.33,7.7 ; 12.43,-3 12.43,7.7 ; 12.43,12.7 12.43,18.7 ; 14.63,12.7 14.63,17.7 18.63,17.7 18.63,12.7 ; 20.83,-3 20.83,6.5 20.83,7.7
  text "15" at 7.694,0.251 h1.22
  text "8" at 9.344,-2.249 h1.22
  text "9" at -9.406,0.251 h1.22
  text "1" at -10.513,-2.249 h1.22
Mechanical 2:
  circle w0.13: c16.63,0 r1.5
  circle w0.13: c-16.63,0 r1.5
  lines w0.025: -18.5,0 -14.75,0 ; -16.63,-1.88 -16.63,1.88 ; 14.75,0 18.5,0 ; 16.63,-1.88 16.63,1.88
3D body: height 13.5, standoff -3.5, extent -20.9,-4.25 20.9,17.75

## СНП268-25ВП31-1-4-В [mm]
pads (27):
  rrect50% 1.7x1.7 hole 1: 1(16.495,-1.25)
  round 1.7 hole 1: 2(13.745,-1.25) 3(10.995,-1.25) 4(8.245,-1.25) 5(5.495,-1.25) 6(2.745,-1.25) 7(-0.005,-1.25) 8(-2.755,-1.25) 9(-5.505,-1.25) 10(-8.255,-1.25) 11(-11.005,-1.25) 12(-13.755,-1.25) 13(-16.505,-1.25) 14(15.125,1.25) 15(12.375,1.25) 16(9.625,1.25) 17(6.875,1.25) 18(4.125,1.25) 19(1.375,1.25) 20(-1.385,1.25) 21(-4.135,1.25) 22(-6.885,1.25) 23(-9.635,1.25) 24(-12.385,1.25) 25(-15.135,1.25)
  round 6 hole 3.2: MH1(-23.505,0) MH2(23.495,0)
Top Overlay:
  lines w0.25: -28,3.5 -28,-4.5 28,-4.5 28,4.5 ; -19.5,-4.5 -19.5,4.5 ; 16.135,-4.5 16.135,-5.5 17.135,-5.5 17.135,-4.5 ; 19.5,-4.5 19.5,4.5
Mechanical 1:
  circle w0.13: c-23.505,0 r1.5
  circle w0.13: c23.495,0 r1.5
  lines w0.025: -25.385,0 -21.635,0 ; -23.505,-1.88 -23.505,1.88 ; -23.505,12.08 -23.505,14.45 ; -23.505,14.95 -23.505,15.45 ; -23.505,15.95 -23.505,18.7 ; 21.625,0 25.375,0 ; 23.495,-1.88 23.495,1.88 ; 23.495,12.08 23.495,14.45 ; 23.495,14.95 23.495,15.45 ; 23.495,15.95 23.495,18.7
  lines w0.13: -27.705,7.7 -27.705,-3 27.7,-2.9 ; -25.505,12.7 -25.505,17.7 -21.505,17.7 -21.505,12.7 ; -19.205,-3 -19.205,7.7 ; -19.2,18.7 19.2,18.7 ; -19.105,12.7 -19.105,18.7 ; 19.195,-3.1 19.195,7.6 ; 19.195,12.7 19.195,18.7 ; 21.495,12.7 21.495,17.7 25.495,17.7 25.495,12.7 ; 27.695,-3 27.695,6.5 27.695,7.7
  text "14" at 15.137,0.251 h2
  text "13" at -18.556,-2.249 h2
  text "1" at 16.987,-2.249 h2
  text "25" at -17.449,0.251 h2
Mechanical 2:
  circle w0.13: c-23.505,0 r1.5
  circle w0.13: c23.495,0 r1.5
  lines w0.025: -25.385,0 -21.635,0 ; -23.505,-1.88 -23.505,1.88 ; 21.625,0 25.375,0 ; 23.495,-1.88 23.495,1.88
3D body: height 13.5, standoff -3.5, extent -27.8,-4.25 27.8,17.75

## СНП268-25РП31-1-4-В [mm]
pads (27):
  rrect50% 1.7x1.7 hole 1: 1(-16.505,-1.25)
  round 1.7 hole 1: 2(-13.755,-1.25) 3(-11.005,-1.25) 4(-8.255,-1.25) 5(-5.505,-1.25) 6(-2.755,-1.25) 7(-0.005,-1.25) 8(2.745,-1.25) 9(5.495,-1.25) 10(8.245,-1.25) 11(10.995,-1.25) 12(13.745,-1.25) 13(16.495,-1.25) 14(-15.135,1.25) 15(-12.385,1.25) 16(-9.635,1.25) 17(-6.885,1.25) 18(-4.135,1.25) 19(-1.385,1.25) 20(1.375,1.25) 21(4.125,1.25) 22(6.875,1.25) 23(9.625,1.25) 24(12.375,1.25) 25(15.125,1.25)
  round 6 hole 3.2: МН1(-23.505,0) МН2(23.495,0)
Top Overlay:
  lines w0.25: -27.5,-3.5 -27.5,4.5 ; -27.5,-3 27.5,-3 27.5,4.5 ; -20.5,-3 -20,-3 ; -19.5,-3 -19.5,4.5 ; -17,-3 -17,-4 -16,-4 -16,-3 ; 19.5,-3 19.5,4.5
Mechanical 1:
  circle w0.13: c-23.505,0 r1.5
  circle w0.13: c23.495,0 r1.5
  lines w0.025: -25.385,0 -21.635,0 ; -23.505,-1.88 -23.505,1.88 ; -23.505,12.08 -23.505,14.45 ; -23.505,14.95 -23.505,15.45 ; -23.505,15.95 -23.505,18.7 ; 21.625,0 25.375,0 ; 23.495,-1.88 23.495,1.88 ; 23.495,12.08 23.495,14.45 ; 23.495,14.95 23.495,15.45 ; 23.495,15.95 23.495,18.7
  lines w0.13: -27.705,7.7 -27.705,-3 27.7,-2.9 ; -25.505,12.7 -25.505,17.7 -21.505,17.7 -21.505,12.7 ; -19.205,-3 -19.205,7.7 ; -19.2,18.7 19.2,18.7 ; -19.105,12.7 -19.105,18.7 ; 19.195,-3.1 19.195,7.6 ; 19.195,12.7 19.195,18.7 ; 21.495,12.7 21.495,17.7 25.495,17.7 25.495,12.7 ; 27.695,-3 27.695,6.5 27.695,7.7
  text "1" at -18.013,-2.249 h2
  text "13" at 16.444,-2.249 h2
  text "14" at -17.363,0.251 h2
  text "25" at 15.051,0.251 h2
Mechanical 2:
  circle w0.13: c-23.505,0 r1.5
  circle w0.13: c23.495,0 r1.5
  lines w0.025: -25.385,0 -21.635,0 ; -23.505,-1.88 -23.505,1.88 ; 21.625,0 25.375,0 ; 23.495,-1.88 23.495,1.88
3D body: height 13.6, standoff -3.2, extent -26.6,-3.25 26.6,17.95

## СНП268-37ВП31-1-4-В [mm]
pads (39):
  round 1.7 hole 1: 1(24.745,-1.255) 2(21.995,-1.255) 3(19.245,-1.255) 4(16.495,-1.255) 5(13.745,-1.255) 6(10.995,-1.255) 7(8.245,-1.255) 8(5.495,-1.255) 9(2.745,-1.255) 10(-0.005,-1.255) 11(-2.755,-1.255) 12(-5.505,-1.255) 13(-8.255,-1.255) 14(-11.005,-1.255) 15(-13.755,-1.255) 16(-16.505,-1.255) 17(-19.255,-1.255) 18(-22.005,-1.255) 19(-24.755,-1.255) 20(23.375,1.245) 21(20.625,1.245) 22(17.875,1.245) 23(15.125,1.245) 24(12.375,1.245) 25(9.625,1.245) 26(6.875,1.245) 27(4.125,1.245) 28(1.375,1.245) 29(-1.385,1.245) 30(-4.135,1.245) 31(-6.885,1.245) 32(-9.635,1.245) 33(-12.385,1.245) 34(-15.135,1.245) 35(-17.885,1.245) 36(-20.635,1.245) 37(-23.385,1.245)
  round 6 hole 3.2: 38(-31.755,-0.005) 39(31.745,-0.005)
Top Overlay:
  lines w0.25: -36.25,4.5 -36.25,-4.5 36.25,-4.5 36.25,4.5 ; -27.5,-4.5 -27.5,4.5 ; 24.5,-4.5 24.5,-5.5 25.5,-5.5 25.5,-4.5 ; 27.5,-4.5 27.5,4.5
Mechanical 1:
  circle w0.13: c31.745,-0.005 r1.5
  circle w0.13: c-31.755,-0.005 r1.5
  lines w0.025: -33.635,-0.005 -29.885,-0.005 ; -31.755,-1.885 -31.755,1.875 ; -31.755,12.075 -31.755,14.445 ; -31.755,14.945 -31.755,15.445 ; -31.755,15.945 -31.755,18.695 ; 29.875,-0.005 33.625,-0.005 ; 31.745,-1.885 31.745,1.875 ; 31.745,12.075 31.745,14.445 ; 31.745,14.945 31.745,15.445 ; 31.745,15.945 31.745,18.695
  lines w0.13: -36,7.75 -36,-4.25 36,-4.25 36,7.75 ; -33.755,12.695 -33.755,17.695 -29.755,17.695 -29.755,12.695 ; -27.5,18.7 27.5,18.7 ; -27.455,-3.005 -27.455,7.695 ; -27.455,12.695 -27.455,18.695 ; 27.445,-3.005 27.445,7.695 ; 27.545,12.695 27.545,18.695 ; 29.745,12.695 29.745,17.695 33.745,17.695 33.745,12.695
  text "20" at 22.551,0.251 h2
  text "19" at -26.056,-2.249 h2
  text "1" at 24.487,-2.249 h2
  text "37" at -24.949,0.251 h2
Mechanical 2:
  circle w0.13: c31.745,-0.005 r1.5
  circle w0.13: c-31.755,-0.005 r1.5
  lines w0.025: -33.635,-0.005 -29.885,-0.005 ; -31.755,-1.885 -31.755,1.875 ; 29.875,-0.005 33.625,-0.005 ; 31.745,-1.885 31.745,1.875
3D body: height 13.5, standoff -3.5, extent -36,-4.25 36,17.75